# Altium integrated library YenDoo.IntLib: 60 symbols
Pins are listed as number, name and electrical type; pins without a type are passive.

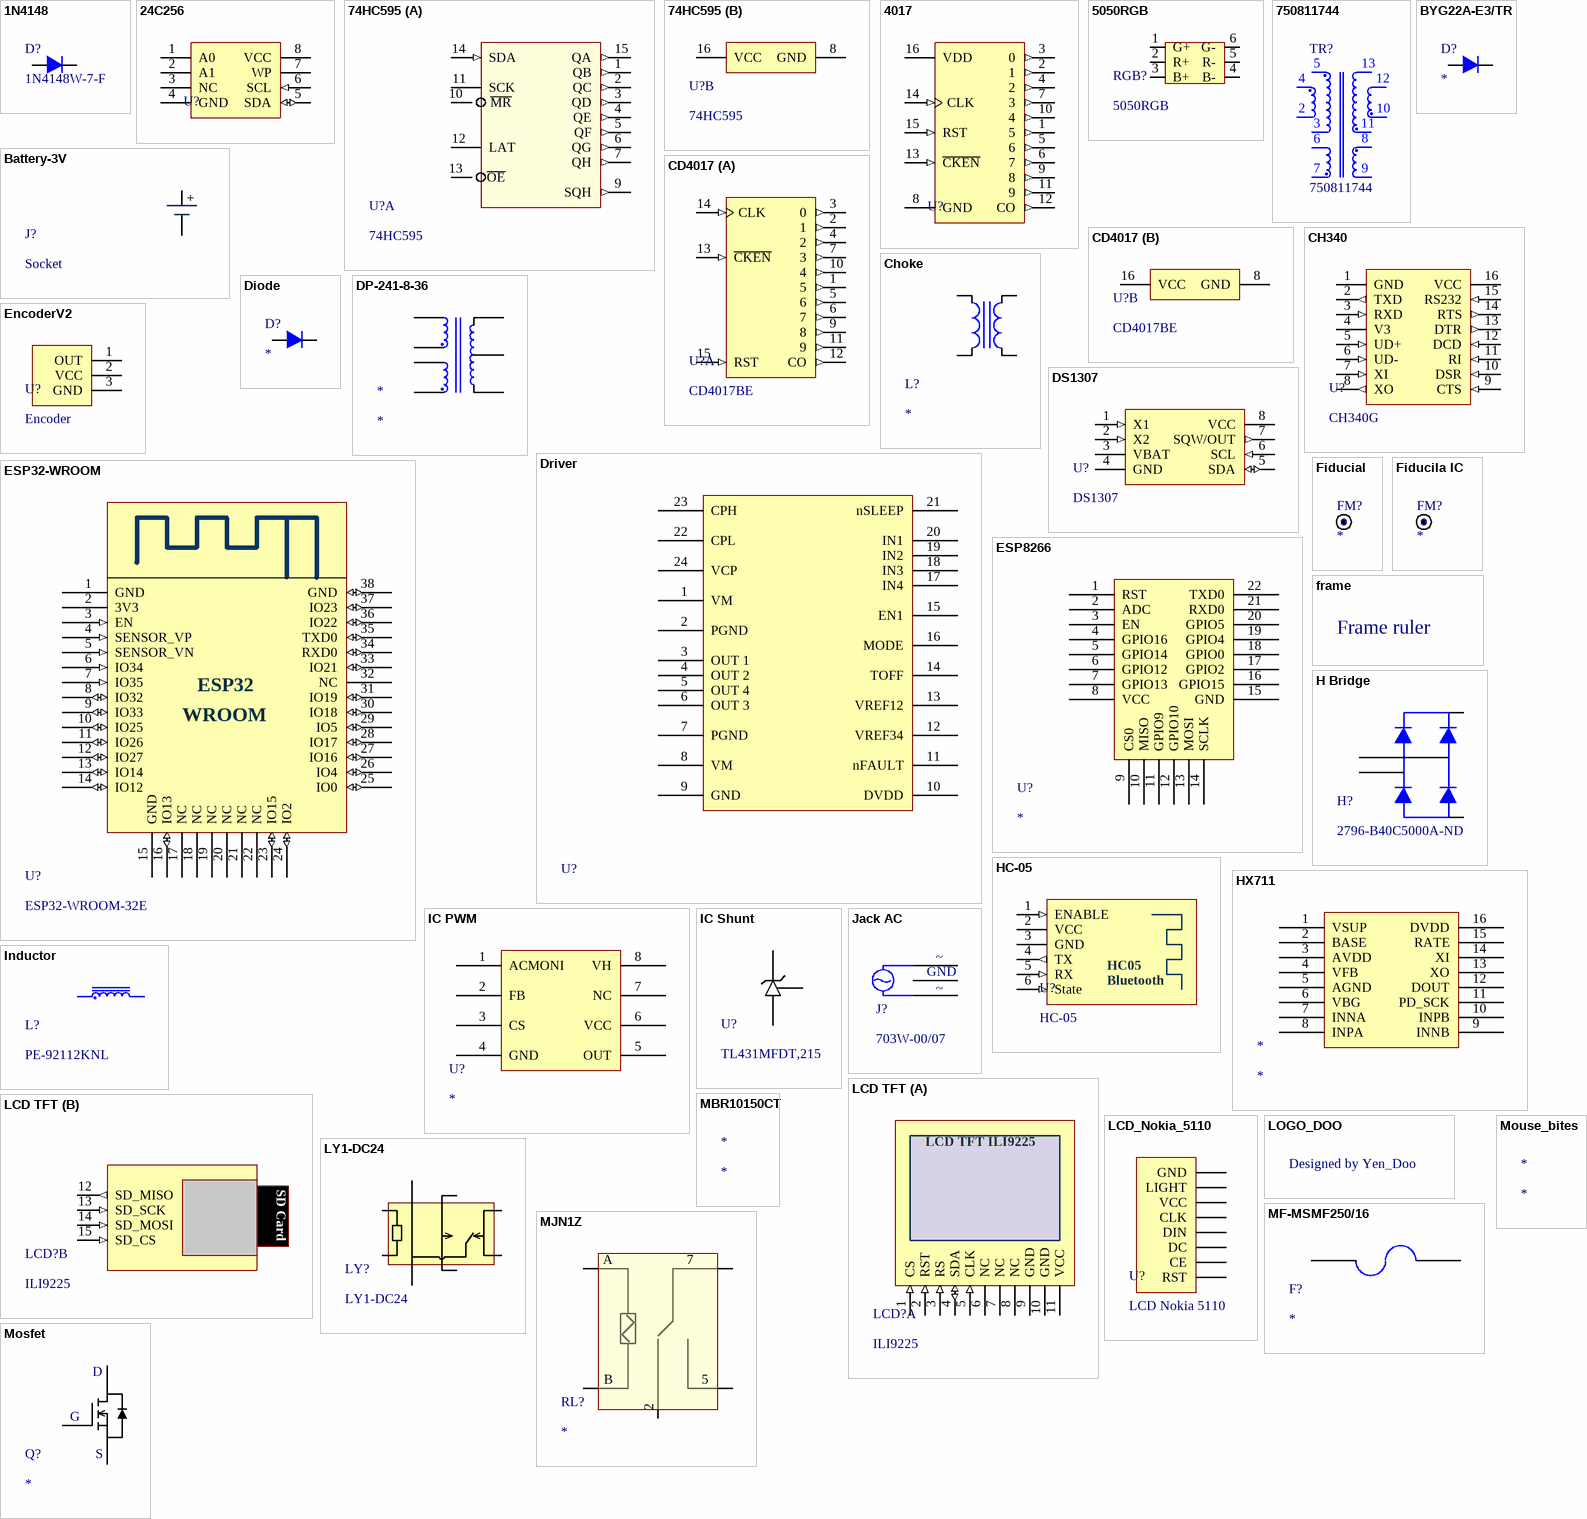
[diagram p0: symbols 1N4148 to Mouse_bites]

## 1N4148
designator D?, comment 1N4148W-7-F
Diode Standard 100 V 300mA (DC) Surface Mount SOD-123; Mfr: Diodes Incorporated; Voltage - DC Reverse (Vr) (Max): 100 V; Voltage - Forward (Vf) (Max) @ If: 1.25 V @ 150 mA; Speed: Small Signal =< 200mA (Io), Any Speed; Reverse Recovery Time (trr): 4 ns; Current - Reverse Leakage @ Vr: 1 µA @ 100 V; Capacitance @ Vr, F: 2pF @ 0V, 1MHz; ComponentLink1Description: New link; ComponentLink1URL: https://www.digikey.com/en/products/detail/diodes-incorporated/1N4148W-7-F/814371; Diode Type: Standard; Current - Average Rectified (Io): 300mA (DC); Mounting Type: Surface Mount
footprint 1N4148 (SODFL, 2-Leads, Body 1.55x4.05mm, IPC Medium Density)
pins: 1 A, 2 K

## 24C256
designator U?  (value not drawn)
EEPROM Memory IC 256Kb (32K x 8) I²C 1 MHz 550 ns 8-SOIC; Mfr: Microchip Technology; Memory Type: Non-Volatile; Clock Frequency: 1 MHz; Write Cycle Time - Word, Page: 5ms; Access Time: 550 ns; Voltage - Supply: 1.7V ~ 5.5V; Base Product Number: AT24C256C; Category: Integrated Circuits (ICs); Memory Format: EEPROM; Technology: EEPROM; Memory Size: 256Kb (32K x 8); Memory Interface: I²C; Operating Temperature: -40°C ~ 85°C (TA); Mounting Type: Surface Mount; Package / Case: 8-SOIC (0.154", 3.90mm Width); Supplier Device Package: 8-SOIC; ComponentLink1Description: Digikey; ComponentLink1URL: https://www.digikey.com/en/products/detail/microchip-technology/AT24C256C-SSHL-T/2271166
footprint SOIC-8 (SOIC, 8-Leads, Body 5.00x4.00mm, Pitch 1.27mm, IPC Medium Density)
pins: 1 A0, 2 A1, 3 NC, 4 GND (power), 5 SDA (io), 6 SCL (in), 7 WP, 8 VCC (power)

## 74HC595
designator U?
8-Bit Shift Registers With 3-State Output Registers; Mfr: Texas Instruments; Output Type: Tri-State; Number of Elements: 1; Number of Bits per Element: 8; Function: Serial to Parallel, Serial; Voltage - Supply: 2V ~ 6V; Logic Type: Shift Register; ComponentLink1Description: datasheet; ComponentLink1URL: https://www.ti.com/lit/ds/scls041j/scls041j.pdf?ts=1672570074626&ref_url=https%253A%252F%252Fwww.google.com%252F; Operating Temperature: -40°C ~ 85°C; Mounting Type: Surface Mount; Package / Case: 16-SOIC (0.154", 3.90mm Width)
footprint SOT16 (SOIC, 16-Leads, Body 10.20x5.30mm, Pitch 1.27mm, IPC Medium Density)
part A pins: 1 QB (out), 2 QC (out), 3 QD (out), 4 QE (out), 5 QF (out), 6 QG (out), 7 QH (out), 9 SQH (out) "OUTPUT", 10    ~{MR} "OUTPUT", 11 SCK "OUTPUT", 12 LAT "OUTPUT", 13   ~{OE} "OUTPUT", 14 SDA (in) "OUTPUT", 15 QA (out)
part B pins: 8 GND, 16 VCC

## 4017
designator U?, comment CD4017BM  (value not drawn)
Counter ICs CMOS Decade Counter; Manufacturer: Texas Instruments; Logic Family: CD4000; Number of Bits: 10 bit; Counting Method: Synchronous; Counting Sequence: Up; Operating Supply Voltage: 3 V to 18 V; Output Current: 1.5 mA; Product Category: Counter ICs; Counter Type: Decade; Minimum Operating Temperature: - 55 C; Maximum Operating Temperature: + 125 C
footprint SOP16 (SOP, 16-Leads, Body 10.20x5.30mm, Pitch 1.27mm, IPC Medium Density)
footprint SO16 (SOIC, 16-Leads, Body 9.90x3.90mm, Pitch 1.27mm, IPC Medium Density)
pins: 1 5 (out), 2 1 (out), 3 0 (out), 4 2 (out), 5 6 (out), 6 7 (out), 7 3 (out), 8 GND (power), 9 8 (out), 10 4 (out), 11 9 (out), 12 CO (out), 13 ~{CKEN} (in), 14 CLK (in), 15 RST (in), 16 VDD (power)

## 5050RGB
designator RGB?
Led rgb 5050
footprint 5050RGB
pins: 1 G+, 2 R+, 3 B+, 4 B-, 5 R-, 6 G-

## 750811744
designator TR?
Flyback Converters For For DC/DC Converters SMPS Transformer 4000Vrms Isolation 80kHz Through Hole; Mfr: Würth Elektronik; Inductance @ Frequency: 450µH @ 10kHz; Voltage - Auxiliary: 14V @ 50mA; Voltage - Primary: 90 ~ 375V; Height - Seated (Max): 1.200" (30.48mm); Size / Dimension: 1.559" L x 1.700" W (39.60mm x 43.18mm); Mounting Type: Through Hole; Frequency: 80kHz; Operating Temperature: -40°C ~ 125°C; Voltage - Isolation: 4000Vrms; Applications: Flyback Converters; Type: For DC/DC Converters; Package: Tray; Series: MID-OLON; Category: Transformers
footprint 750811744
pins: 2, 3, 4, 5, 6, 7, 8, 9, 10, 11, 12, 13

## Battery-3V
designator J?, comment Socket
Socket CR1220 SMD
footprint SocketPin3V
pins: 1 Vcc, 2 GND
text: +

## BYG22A-E3/TR
designator D?
footprint BYG22A-E3/TR (Molded Diode, 2-Leads, Body 5.28x2.67mm, IPC Medium Density)
pins: 1 A, 2 K

## CD4017
designator U?, comment CD4017BE
IC 10-OUT DECADE COUNTER 16-DIP; Mfr: Texas Instruments; Logic Type: Counter, Decade; Direction: Up; Number of Elements: 1; Number of Bits per Element: 10; Reset: Asynchronous; Timing: Synchronous; Count Rate: 5.5 MHz; Trigger Type: Positive Edge; Voltage - Supply: 3 V ~ 18 V; Category: Integrated Circuits (ICs); ComponentLink1Description: thegioiic; ComponentLink1URL: https://www.thegioiic.com/cd40174be-ic-flip-flop-d-type-positive-edge-16mhz-16-dip; Operating Temperature: -55°C ~ 125°C; Mounting Type: Through Hole; Package / Case: 16-DIP (0.300", 7.62mm)
part A pins: 1 5 (out), 2 1 (out), 3 0 (out), 4 2 (out), 5 6 (out), 6 7 (out), 7 3 (out), 9 8 (out), 10 4 (out), 11 9 (out), 12 CO (out), 13 ~{CKEN} (in), 14 CLK (in), 15 RST (in)
part B pins: 8 GND, 16 VCC

## CH340
designator U?, comment CH340G
USB Bridge, USB to UART USB 2.0 UART Interface; Mfr: SparkFun Electronics; Standards: USB 2.0; Voltage - Supply: 3V ~ 3.6V; Current - Supply: 20mA; Protocol: USB; Function: Bridge, USB to UART; Interface: UART; Operating Temperature: -20°C ~ 70°C (TA); ComponentLink1Description: Thegioiic; ComponentLink1URL: https://www.thegioiic.com/ch340g; ComponentLink2Description: Datasheet; ComponentLink2URL: https://www.thegioiic.com/upload/documents/5d39d5f0043101a4c964078db79fe1bd.PDF
footprint DSIP-16 (SOIC, 16-Leads, Body 10.40x5.30mm, Pitch 1.27mm, Thermal Pad 0.00x0.00mm, IPC Medium Density)
pins: 1 GND (power), 2 TXD (out), 3 RXD (in), 4 V3 (power), 5 UD+ (in), 6 UD- (in), 7 XI (in), 8 XO (out), 9 CTS (in), 10 DSR (in), 11 RI (in), 12 DCD (in), 13 DTR (out), 14 RTS (out), 15 RS232 (in), 16 VCC (power)

## Choke
designator L?
Common Mode Chokes / Filters 1amp 20uH; Manufacturer: KEMET; Number of Channels: 1 Channel; Maximum DC Current: 1 A; Test Frequency: 1 kHz; Product Category: Common Mode Chokes / Filters; Mounting Style: Vertical Mount; Series: SU-9VD; Termination Style: Through Hole; Inductance: 20 uH; Minimum Operating Temperature: - 25 C; Maximum Operating Temperature: + 120 C; Length: 17 mm; Width: 11 mm; Height: 17 mm; Product: Common Mode Chokes
pins: 1, 2, 3, 4

## Diode
designator D?
footprint SMA (Molded Diode, 2-Leads, Body 4.38x2.50mm, IPC Medium Density)
footprint MBR10150CT (TO-220F-3)
footprint Flat Lead (SODFL, 2-Leads, Body 1.45x2.60mm, IPC Medium Density)
pins: 1 A, 2 K

## DP-241-8-36
designator *
pins: 1 F2, 2 S2, 3 F1, 4 S1, 5 S, CT 6, F 7

## Driver
designator U?, comment DRV8955PRGER  (value not drawn)
Half Bridge (4) Driver DC Motors, Solenoids Power MOSFET 24-VQFN (4x4); Mfr: Texas Instruments; Interface: Logic, PWM; Load Type: Inductive, Resistive; Rds On (Typ): 165mOhm; Current - Output / Channel: 10A; Voltage - Supply: 4.5V ~ 48V; Fault Protection: Over Current, Over Voltage, UVLO; Output Configuration: Half Bridge (4); Applications: DC Motors, Solenoids; Technology: Power MOSFET; Current - Peak Output: 10A; Voltage - Load: 4.5V ~ 48V; Operating Temperature: -40°C ~ 125°C; Features: Charge Pump; Supplier Device Package: 24-VQFN (4x4); ComponentLink1Description: Digikey; ComponentLink1URL: https://www.digikey.com/en/products/detail/texas-instruments/DRV8955PRGER/13627200
footprint DRV8955
pins: 1 VM, 2 PGND, 3 OUT 1, 4 OUT 2, 5 OUT 4, 6 OUT 3, 7 PGND, 8 VM, 9 GND, 10 DVDD, 11 nFAULT, 12 VREF34, 13 VREF12, 14 TOFF, 15 EN1, 16 MODE, 17 IN4, 18 IN3, 19 IN2, 20 IN1, 21 nSLEEP, 22 CPL, 23 CPH "Charge pump switching node. Connect a X7R, 0.022-μF, VM-rated ceramic capacitor from CPH to CPL.", 24 VCP

## DS1307
designator U?
Real Time Clock (RTC) IC Clock/Calendar 56B I²C, 2-Wire Serial 8-SDIP (0.300", 7.62mm); Mfr: Analog Devices Inc./Maxim Integrated; Time Format: HH:MM:SS (12/24 hr); Date Format: YY-MM-DD-dd; Voltage - Supply: 4.5V ~ 5.5V; Voltage - Supply, Battery: 2V ~ 3.5V; Current - Timekeeping (Max): 200µA @ 5V; Category: Integrated Circuits (ICs); Type: Clock/Calendar; Features: Leap Year, NVSRAM, Square Wave Output; Memory Size: 56B; Interface: I²C, 2-Wire Serial; Operating Temperature: 0°C ~ 70°C; Base Product Number: DS1307; ComponentLink1Description: Datasheet; ComponentLink1URL: https://www.analog.com/media/en/technical-documentation/data-sheets/ds1307.pdf; ComponentLink2Description: Thegioiic; ComponentLink2URL: https://www.thegioiic.com/ds1307z-ic-rtc-clock-calendar-56b-8-soic
footprint SOIC-4 (SOIC, 8-Leads, Body 4.88x3.91mm, Pitch 1.27mm, Thermal Pad 0.00x0.00mm, IPC Medium Density)
pins: 1 X1 (in), 2 X2 (in), 3 VBAT (power), 4 GND (power), 5 SDA (io), 6 SCL (in), 7 SQW/OUT (out), 8 VCC (power)

## EncoderV2
designator U?, comment Encoder
Mạch Cảm Biến Tốc Độ Encoder V2; Supply voltage: 3.3-5V; Supply current: 15mA; Output signal level: Digital TTL; Distance tranceiver: 5mm
footprint EncoderV2
pins: 1 OUT, 2 VCC, 3 GND

## ESP32-WROOM
designator U?, comment ESP32-WROOM-32E
Bluetooth, WiFi 802.11b/g/n, Bluetooth v4.2 +EDR, Class 1, 2 and 3 Transceiver Module 2.4GHz ~ 2.5GHz Integrated, Trace Surface Mount; Mfr: Espressif Systems; Utilized IC / Part: ESP32-D0WD-V3; Modulation: CCK, DSSS, OFDM; Data Rate: 150Mbps; Power - Output: 20dBm; Sensitivity: -98dBm; Serial Interfaces: ADC, GPIO, I²C, I²S, PWM, SDIO, SPI, UART; Memory Size: 4MB Flash, 448kB ROM, 536kB SRAM; Voltage - Supply: 3V ~ 3.6V; Category: RF and Wireless; Series: ESP32; RF Family/Standard: Bluetooth, WiFi; Protocol: 802.11b/g/n, Bluetooth v4.2 +EDR, Class 1, 2 and 3; Frequency: 2.4GHz ~ 2.5GHz; Antenna Type: Integrated, Trace; Mounting Type: Surface Mount; ComponentLink1Description: Hshop; ComponentLink1URL: https://hshop.vn/products/mach-thu-phat-wifi-ble-soc-esp32-v1; Operating Temperature: -40°C ~ 85°C; ComponentLink2Description: Datasheet; ComponentLink2URL: https://www.espressif.com/sites/default/files/russianDocumentation/esp32-wroom-32e_esp32-wroom-32ue_datasheet_en.pdf
footprint ESP32-WROOM
pins: 1 GND (power), 2 3V3 (power), 3 EN (in), 4 SENSOR_VP (in), 5 SENSOR_VN (in), 6 IO34 (in), 7 IO35 (in), 8 IO32 (io), 9 IO33 (io), 10 IO25 (io), 11 IO26 (io), 12 IO27 (io), 13 IO14 (io), 14 IO12 (io), 15 GND (power), 16 IO13 (io), 17 NC (hiz), 18 NC (hiz), 19 NC (hiz), 20 NC (hiz), 21 NC (hiz), 22 NC (hiz), 23 IO15 (io), 24 IO2 (io), 25 IO0 (io), 26 IO4 (io), 27 IO16 (io), 28 IO17 (io), 29 IO5 (io), 30 IO18 (io), 31 IO19 (io), 32 NC (hiz), 33 IO21 (io), 34 RXD0 (io), 35 TXD0 (io), 36 IO22 (io), 37 IO23 (io), 38 GND (io)
text: WROOM

## ESP8266
designator U?
footprint ESP8266
pins: 1 RST, 2 ADC, 3 EN, 4 GPIO16, 5 GPIO14, 6 GPIO12, 7 GPIO13, 8 VCC, 9 CS0, 10 MISO, 11 GPIO9, 12 GPIO10, 13 MOSI, 14 SCLK, 15 GND, 16 GPIO15, 17 GPIO2, 18 GPIO0, 19 GPIO4, 20 GPIO5, 21 RXD0, 22 TXD0

## Fiducial
designator FM?
footprint FUDICIAL_MARKER

## Fiducila IC
designator FM?
footprint Fiducial Mark IC

## frame
designator FR?, comment Frame  (value not drawn)
Frame in ruler
footprint Frame_Rec in TopOverlay
text: Frame ruler

## H Bridge
designator H?, comment 2796-B40C5000A-ND
Bridge Rectifier Single Phase Standard 80 V Through Hole 4-SIP; Voltage - Peak Reverse (Max): 80 V; Current - Average Rectified (Io): 4 A; Voltage - Forward (Vf) (Max) @ If: 1 V @ 5 A; Current - Reverse Leakage @ Vr: 5 µA @ 80 V; Diode Type: Single Phase; Technology: Standard; Operating Temperature: -50°C ~ 150°C (TJ); Mounting Type: Through Hole; Package / Case: 4-SIP; Supplier Device Package: 4-SIP; ComponentLink1Description: Digikey; ComponentLink1URL: https://www.digikey.com/en/products/detail/diotec-semiconductor/B40C5000A/13155422
footprint b40c500033
footprint GBJ-4
pins: 1 +, 2 ~, 3 ~, 4 -

## HC-05
designator U?
HC-05 Bluetooth module follows the IEEE 802.15.1 standardized protocol, through which one can build a wireless Personal Area Network (PAN). It uses frequency-hopping spread spectrum (FHSS) radio technology to send data over the air.; Bluetooth protocol: Bluetooth Specification v2.0+EDR; Frequency: 2.4GHz ISM band; Modulation: GFSK (Gaussian Frequency Shift Keying); Emission power: ≤4dBm, Class 2; Sensitivity: ≤-84dBm at 0.1% BER; Speed: Asynchronous communication: 2.1Mbps (Max) / 160 kbps, Synchronous communication: 1Mbps/1Mbps; Security: Authentication and encryption; Supply Voltage: +3.3V to 6.0 V; Supply Current: 30mA; Working temperature: -20 ~ +75Centigrade; Dimension: 26.9mm x 13mm x 2.2 mm; ComponentLink1Description: Hshop; ComponentLink1URL: https://hshop.vn/products/mach-thu-phat-bluetooth-hc-05-do-ra-chon-master
footprint HC-05
pins: 1 ENABLE (in), 2 VCC (power), 3 GND (power), 4 TX (out), 5 RX (in), 6 State (in)
text: HC05; Bluetooth

## HX711
designator *
footprint HX711 (TSOP, 16-Leads, Body 9.90x3.90mm, Pitch 1.27mm, IPC Medium Density)
pins: 1 VSUP, 2 BASE, 3 AVDD, 4 VFB, 5 AGND, 6 VBG, 7 INNA, 8 INPA, 9 INNB, 10 INPB, 11 PD_SCK, 12 DOUT, 13 XO, 14 XI, 15 RATE, 16 DVDD

## IC PWM
designator U?
footprint SOP-J8 (SOIC, 8-Leads, Body 5.00x4.00mm, Pitch 1.27mm, IPC Medium Density)
pins: 1 ACMONI, 2 FB, 3 CS, 4 GND, 5 OUT, 6 VCC, 7 NC, 8 VH

## IC Shunt
designator U?, comment TL431MFDT,215
IC VREF SHUNT ADJ 2% TO236AB; Mfr: Nexperia USA Inc.; Output Type: Adjustable; Voltage - Output (Min/Fixed): 2.495V; Voltage - Output (Max): 36 V; Current - Output: 100 mA; Current - Cathode: 1 mA; Base Product Number: TL431; Category: Integrated Circuits (ICs); Reference Type: Shunt; Tolerance: ±2%; Operating Temperature: -40°C ~ 125°C (TA); Mounting Type: Surface Mount; Package / Case: TO-236-3, SC-59, SOT-23-3; Parameter 14: *; ComponentLink1Description: Digikey; ComponentLink1URL: https://www.digikey.com/en/products/detail/nexperia-usa-inc/TL431MFDT-215/2780405
footprint TO-236AB (SOT223, 3-Leads, Body 2.90x2.30mm (avg), Pitch 1.90mm, IPC Medium Density)
pins: 1, 2, 3

## Inductor
designator L?, comment PE-92112KNL
100 µH Unshielded Toroidal Inductor 5 A 34mOhm Max Radial, Vertical (Open); Mfr: Pulse Electronics Power; Inductance: 100 µH; Tolerance: ±20%; Current Rating (Amps): 5 A; Inductance Frequency - Test: 20 kHz; Type: Toroidal; DC Resistance (DCR): 34mOhm Max; Operating Temperature: -40°C ~ 130°C; Mounting Type: Through Hole; Size / Dimension: 1.300" L x 0.700" W (33.02mm x 17.78mm); Height - Seated (Max): 1.400" (35.56mm); ComponentLink1Description: Digikey; ComponentLink1URL: https://www.digikey.com/en/products/detail/pulse-electronics-power/PE-92112KNL/2265966?s=N4IgTCBcDaIAoFEC0BOMBGdYDSA5AMiALoC%2BQA
footprint PE-92112KNL
pins: 1, 2

## Jack AC
designator J?, comment 703W-00/07
Power Entry Connector Receptacle, Male Blades IEC 320-C14 Panel Mount, Flange; Mfr: Qualtek; Current - IEC: 10A; Voltage - IEC: 250VAC; Number of Positions: 3; Panel Thickness: 0.118" (3.00mm); Connector Style: IEC 320-C14; Mounting Type: Panel Mount, Flange; Through Hole, Right Angle; Panel Cutout Dimensions: Rectangular - 31.10mm x 23.30mm; ComponentLink1Description: Digikey; ComponentLink1URL: https://www.digikey.com/en/products/detail/qualtek/703W-00-54/245561
footprint 703w0007
footprint 703w0053
pins: 1 VAC, 2 GND, 3 VAC
text: ~

## LCD TFT
designator LCD?, comment ILI9225
The ILI9225 is a 262,144-color one-chip SoC driver for a-TFT liquid crystal display with resolution of 176RGBx220 dots, comprising a 528-channel source driver, a 220-channel gate driver, 87120 bytes RAM for graphic data of 176RGBx220 dots, and power supply circuit.; Display Color: 16BIT RGB 65K color; Screen Size: 2.2(inch); Resolution: 176*220 (Pixel); Module Interface: 4-wire SPI interface; Backlight: 3 White Led; Active Area: 34.85x43.56 (mm); Module PCB Size: 42.46x67.20 (mm); Operating Voltage: 5V/3.3V; Power Consumption: TBD; Rough Weight(Package containing): 23 (g); SKU: MAR2201; Type: TFT; Driver IC: ILI9225; Operating Temperature: -20℃~60℃; Storage Temperature: -30℃~70℃; ComponentLink1Description: Hshop; ComponentLink1URL: https://hshop.vn/products/man-hinh-lcd-tft-2-inch-ili9225-giao-tiep-spi; ComponentLink2Description: Thegioiic; ComponentLink2URL: https://www.thegioiic.com/lcd-2inch-176x220-tft-ili9225-giao-tiep-spi
footprint LCD TFT ILI9225
part A pins: 1 CS (in), 2 RST (in), 3 RS (in), 4 SDA (io), 5 CLK (in), 6 NC, 7 NC, 8 NC, 9 GND (power), 10 GND (power), 11 VCC (power)
part B pins: 12 SD_MISO (out), 13 SD_SCK (in), 14 SD_MOSI (in), 15 SD_CS (in)
part A text: LCD TFT ILI9225
part B text: SD Card

## LCD_Nokia_5110
designator U?, comment LCD Nokia 5110
footprint LCD5110
pins: 1 RST, 2 CE, 3 DC, 4 DIN, 5 CLK, 6 VCC, 7 LIGHT, 8 GND

## LOGO_DOO
designator *  (value not drawn)
footprint Logo_Top_Layer
footprint Logo_Top_Overlay
footprint LogoPIFWeb
text: Designed by Yen_Doo

## LY1-DC24
designator LY?
General Purpose Relay SPDT (1 Form C) 24VDC Coil Socketable; Mfr: Omron Automation and Safety; Contact Rating (Current): 15 A; Switching Voltage: 250VAC, 125VDC - Max; Coil Current: 36.9 mA; Coil Type: Non Latching; Must Operate Voltage: 19.2 VDC; Must Release Voltage: 2.4 VDC; Operate Time: 25 ms; Coil Resistance: 650 Ohms; ComponentLink1Description: New link; ComponentLink1URL: https://www.digikey.com/en/products/detail/omron-automation-and-safety/LY1-DC24/126843?s=N4IgTCBcDaIDIE0CMBaAIgYTAFhAXQF8g; Mounting Type: Socketable; Coil Voltage: 24VDC; Contact Form: SPDT (1 Form C); Termination Style: Plug In; Release Time: 25 ms; Operating Temperature: -25°C ~ 55°C
footprint LY1-DC24
pins: 1, 2, 3, 4, 5, 6, 7, 8

## MBR10150CT
designator *

## MF-MSMF250/16
designator F?
footprint MF-MSMF250/16
pins: 1, 2

## MJN1Z
designator RL?
footprint MJN1Z
pins: 2 NC, 5 NO, 7 COM, A, B

## Mosfet
designator Q?
footprint FQPF8N90C (TO-220F-3)
pins: 1 G, 2 D, 3 S

## Mouse_bites
designator *
footprint Mouse_bites

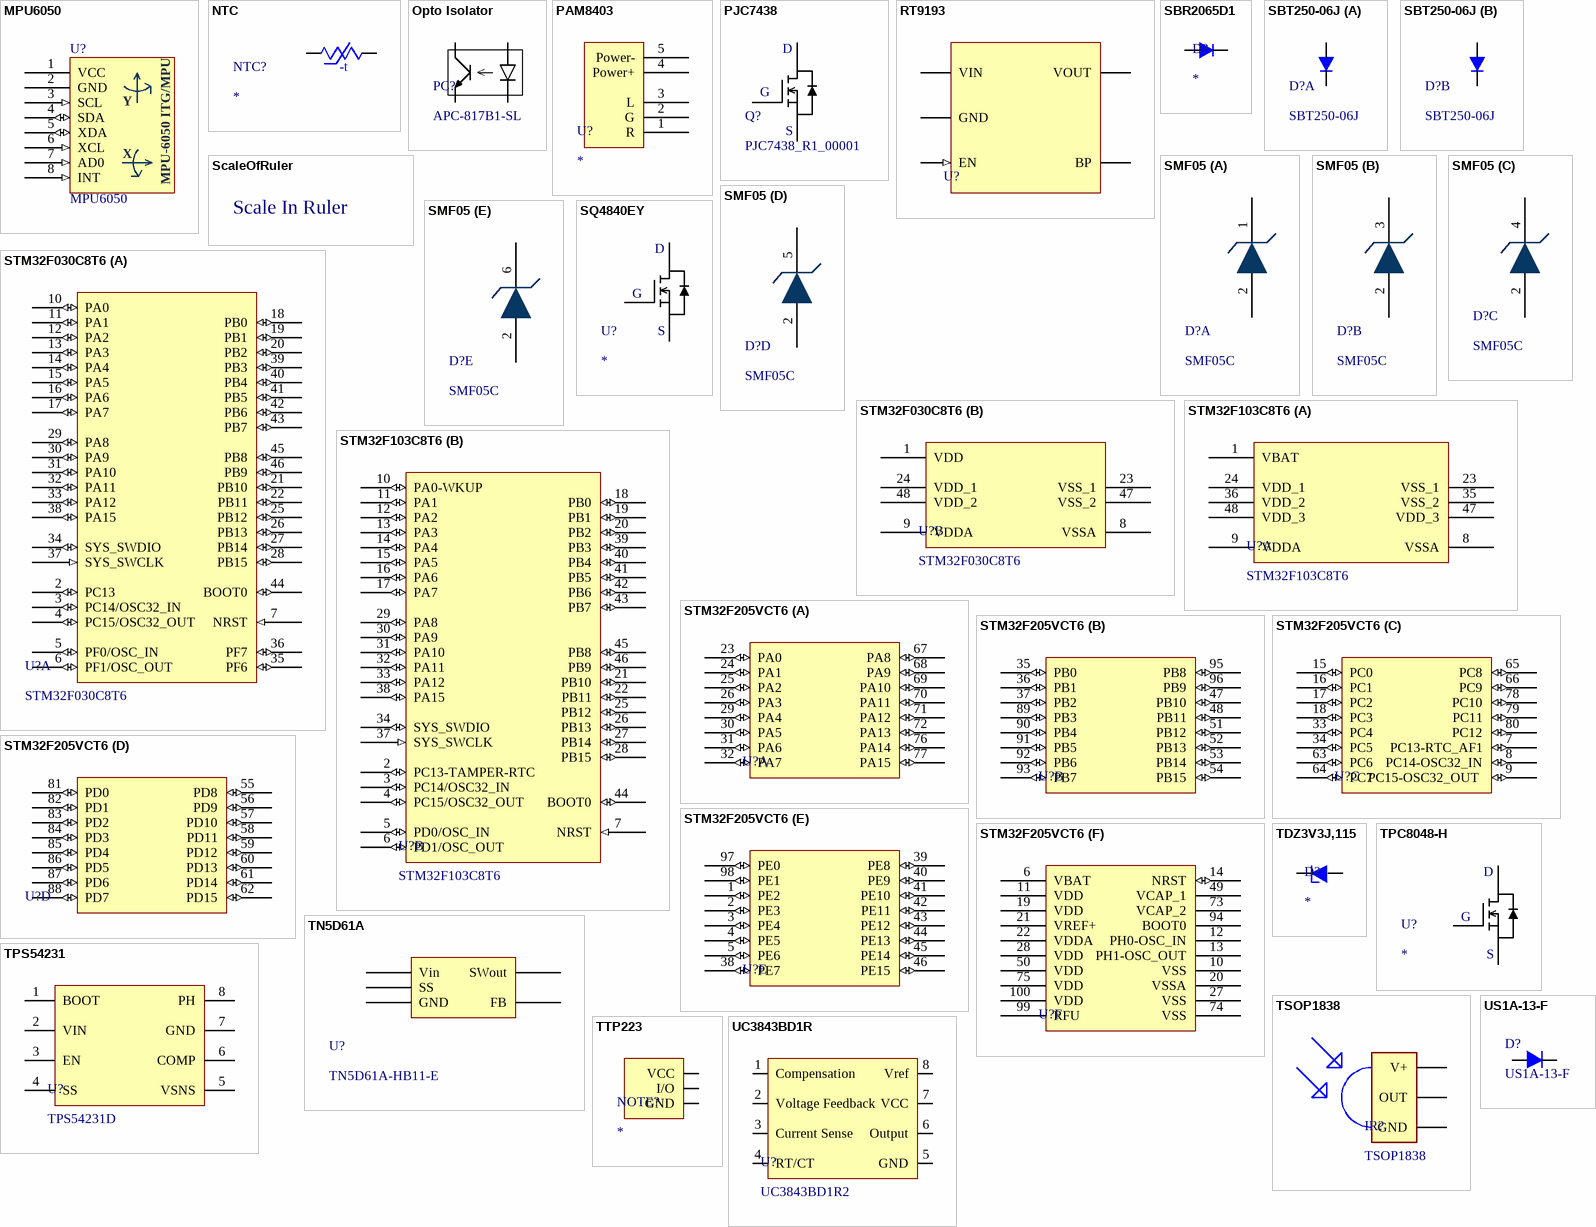
[diagram p1: symbols MPU6050 to US1A-13-F]

## MPU6050
designator U?
The MPU-6050™ parts are the world’s first MotionTracking devices designed for the low power, low cost, and high-performance requirements of smartphones, tablets and wearable sensors.; Mfr: DFRobot; Sensing Range: ±2g, 4g, 8g, 16g, ±250°/sec, ±500°/sec, ±1000°/sec, ±2000°/sec; Sensor Type: Accelerometer, Gyroscope, 3 Axis; Interface: I2C; Voltage - Supply: 3V ~ 5V; Category: Development Boards, Kits, Programmers; Utilized IC / Part: MPU-6050; ComponentLink1Description: Hshop; ComponentLink1URL: https://hshop.vn/products/cam-bien-6-dof-bac-tu-do-gy-521-mpu6050
footprint MPU-6050
pins: 1 VCC (power), 2 GND (power), 3 SCL (in), 4 SDA (io), 5 XDA (io), 6 XCL (in), 7 AD0 (in), 8 INT (in)
text: Y; X; MPU-6050 ITG/MPU

## NTC
designator NTC?
THERMISTOR NTC 15OHM 3000K; Mfr: EPCOS - TDK Electronics; Product Status: Active; R @ 25°C: 15 Ohms; Tolerance: ±20%; Current - Steady State Max: 4 A; Approval Agency: UL; Category: Circuit Protection; Series: S234; Package: Bulk; Diameter: 0.591" (15.00mm); Lead Spacing: 0.295" (7.50mm)
footprint NTC
pins: 1, 2
text: -t

## Opto Isolator
designator PC?, comment APC-817B1-SL
DIP4, DC INPUT, PHOTO TRANSISTOR; Mfr: American Bright Optoelectronics Corporation; Number of Channels: 1; Voltage - Isolation: 5000Vrms; Current Transfer Ratio (Min): 130% @ 5mA; Current Transfer Ratio (Max): 260% @ 5mA; Rise / Fall Time (Typ): 3µs, 4µs; Voltage - Output (Max): 35V; Current - Output / Channel: 50mA; Voltage - Forward (Vf) (Typ): 1.24V; Current - DC Forward (If) (Max): 60 mA; Vce Saturation (Max): 200mV; Category: Isolators; Series: APC-817; Input Type: DC; Output Type: Transistor; Operating Temperature: -55°C ~ 110°C; Package / Case: 4-SMD, Gull Wing; Base Product Number: APC-817; ComponentLink1Description: Digikey; ComponentLink1URL: https://www.digikey.com/en/products/detail/american-bright-optoelectronics-corporation/APC-817B1-SL/16273138?s=N4IgTCBcDaIIIAUDCAOAjAdgLQCE1YGUAZEAXQF8g
footprint APC-817B1-SL (SOP, 4-Leads, Body 4.68x6.60mm, Pitch 2.54mm, IPC Medium Density)
pins: 1, 2, 3, 4

## PAM8403
designator U?
footprint PAM8403
pins: 1 R, 2 G, 3 L, 4 Power+, 5 Power-

## PJC7438
designator Q?, comment PJC7438_R1_00001
N-Channel 50 V 400mA (Ta) 350mW (Ta) Surface Mount SOT-323; Mfr: Panjit International Inc.; Drain to Source Voltage (Vdss): 50 V; Drive Voltage (Max Rds On, Min Rds On): 1.8V, 10V; Rds On (Max) @ Id, Vgs: 1.45Ohm @ 500mA, 10V; Vgs(th) (Max) @ Id: 1V @ 250µA; Gate Charge (Qg) (Max) @ Vgs: 0.95 nC @ 4.5 V; Vgs (Max): ±20V; Input Capacitance (Ciss) (Max) @ Vds: 36 pF @ 25 V; ComponentLink1Description: New link; ComponentLink1URL: https://www.panjit.com.tw/upload/datasheet/PJC7438.pdf; FET Type: N-Channel; Technology: MOSFET (Metal Oxide); Current - Continuous Drain (Id) @ 25°C: 400mA (Ta); Power Dissipation (Max): 350mW (Ta); Operating Temperature: -55°C ~ 150°C (TJ); Mounting Type: Surface Mount; Package / Case: SC-70, SOT-323
footprint PJC7438 (SOT223, 3-Leads, Body 2.00x2.10mm (avg), Pitch 1.40mm, IPC Medium Density)
pins: 1 G, 2 S, 3 D

## RT9193
designator U?, comment RT9193-33GB  (value not drawn)
IC REG LINEAR 3.3V 300MA SOT23-5; Mfr: Richtek USA Inc.; Output Type: Fixed; Number of Regulators: 1; Voltage - Input (Max): 5.5V; Voltage Dropout (Max): 0.3V @ 300mA; Current - Quiescent (Iq): 130 µA; PSRR: 70dB ~ 50dB (100Hz ~ 10kHz); Control Features: Enable; Protection Features: Over Current, Over Temperature; Category: Integrated Circuits (ICs); Voltage - Output (Min/Fixed): 3.3V; ComponentLink1Description: Digikey; ComponentLink1URL: https://www.digikey.com/en/products/detail/richtek-usa-inc/RT9193-33GB/2470048; Current - Output: 300mA; Operating Temperature: -40°C ~ 125°C; Mounting Type: Surface Mount; Package / Case: SC-74A, SOT-753; Supplier Device Package: SOT-23-5; ComponentLink2Description: Thegioiic; ComponentLink2URL: https://www.thegioiic.com/products?search=RT9193; ComponentLink3Description: Datasheet; ComponentLink3URL: https://www.richtek.com/assets/product_file/RT9193/DS9193-18.pdf
footprint SOT-23-5 (SOT23, 5-Leads, Body 2.90x2.79mm, Pitch 1.00mm, IPC Medium Density)
pins: 1 VIN (power), 2 GND (power), 3 EN (in), 4 BP, 5 VOUT (power)

## SBR2065D1
designator D?
ComponentLink1Description: New link; ComponentLink1URL: https://www.diodes.com/assets/Datasheets/SBR2065D1.pdf
footprint SBR2065D1 (D-PAK, 3-Pads, Body 6.20x6.71mm (max), IPC Medium Density)
pins: 1 A, 3 A, 4 K

## SBT250-06J
designator D?
Diode Array 1 Pair Common Cathode Schottky 60 V 25A Through Hole TO-220-3 Full Pack; Mfr: onsemi; Voltage - DC Reverse (Vr) (Max): 60 V; Voltage - Forward (Vf) (Max) @ If: 600 mV @ 10 A; Speed: Fast Recovery =< 500ns, > 200mA (Io); Current - Reverse Leakage @ Vr: 300 µA @ 30 V; Diode Configuration: 1 Pair Common Cathode; Diode Type: Schottky; Current - Average Rectified (Io) (per Diode): 25A; Operating Temperature - Junction: -55°C ~ 150°C; Mounting Type: Through Hole; ComponentLink1Description: Digikey; ComponentLink1URL: https://www.digikey.com/en/products/detail/onsemi/SBT250-06J/2165220
footprint SBT250-06J
part A pins: 1 A, 2 K
part B pins: 1 A, 2 K, 3 A

## ScaleOfRuler
designator SC?, comment Scale in ruler  (value not drawn)
Scale in ruler PCB by PIF
footprint TopLayer_Ruler_10cm_UnitCm
footprint TopLayer_Ruler_10cm_UnitInch
footprint TopOverlay_Ruler_10cm_UnitCm
footprint TopOverlay_Ruler_10cm_UnitInch
text: Scale In Ruler

## SMF05
designator D?, comment SMF05C
12.5V Clamp 8A (8/20µs) Ipp Tvs Diode Surface Mount SC-70-6; Mfr: Semtech Corporation; Type: Zener; Unidirectional Channels: 5; Voltage - Reverse Standoff (Typ): 5V (Max); Voltage - Breakdown (Min): 6V; Power - Peak Pulse: 100W; Capacitance @ Frequency: 130pF @ 1MHz; Category: Circuit Protection; Voltage - Clamping (Max) @ Ipp: 12.5V; Current - Peak Pulse (10/1000µs): 8A (8/20µs); Operating Temperature: -55°C ~ 125°C (TJ); ComponentLink1Description: Datasheet; ComponentLink1URL: https://datasheet.lcsc.com/lcsc/1809291621_SEMTECH-SMF05C-TCT_C85191.pdf*; ComponentLink2Description: Thegioiic; ComponentLink2URL: https://www.thegioiic.com/smf05c-tct
footprint SC70 6L (SOT23, 6-Leads, Body 1.95x2.10mm, Pitch 0.65mm, IPC Medium Density)
part A pins: 1, 2 COM
part B pins: 2 COM, 3
part C pins: 2 COM, 4
part D pins: 2 COM, 5
part E pins: 2 COM, 6

## SQ4840EY
designator U?
ComponentLink1Description: New link; ComponentLink1URL: https://www.vishay.com/docs/68669/sq4840ey.pdf
footprint SQ4840EY (SOIC, 8-Leads, Body 4.90x3.90mm, Pitch 1.27mm, IPC Medium Density)
pins: 1,2,3 S, 4 G, 5,6,7,8 D

## Stamp Hole
designator *  (value not drawn)
footprint Stamp Hole

## STM32F030C8T6
designator U?
ARM® Cortex®-M0 series Microcontroller IC 32-Bit Single-Core 48MHz 64KB (64K x 8) FLASH 48-LQFP (7x7); Mfr: STMicroelectronics; Connectivity: I²C, SPI, UART/USART; Peripherals: DMA, POR, PWM, WDT; Number of I/O: 39; RAM Size: 8K x 8; Voltage - Supply (Vcc/Vdd): 2.4V ~ 3.6V; Data Converters: A/D 12x12b; Oscillator Type: Internal; Core Processor: ARM® Cortex®-M0; Core Size: 32-Bit Single-Core; Speed: 48MHz; Program Memory Size: 64KB (64K x 8); Program Memory Type: FLASH; Operating Temperature: -40°C ~ 85°C (TA); Mounting Type: Surface Mount; Supplier Device Package: 48-LQFP (7x7); ComponentLink1Description: Digikey; ComponentLink1URL: https://www.digikey.com/en/products/detail/stmicroelectronics/STM32F030C8T6/4357252
footprint STM32F030C8T6 (CQFP, 148-Leads, Body 33.75x33.75mm, Pitch 0.64mm, IPC Medium Density)
part A pins: 2 PC13 (io), 3 PC14/OSC32_IN (io), 4 PC15/OSC32_OUT (io), 5 PF0/OSC_IN (io), 6 PF1/OSC_OUT (io), 7 NRST (in), 10 PA0 (io), 11 PA1 (io), 12 PA2 (io), 13 PA3 (io), 14 PA4 (io), 15 PA5 (io), 16 PA6 (io), 17 PA7 (io), 18 PB0 (io), 19 PB1 (io), 20 PB2 (io), 21 PB10 (io), 22 PB11 (io), 25 PB12 (io), 26 PB13 (io), 27 PB14 (io), 28 PB15 (io), 29 PA8 (io), 30 PA9 (io), 31 PA10 (io), 32 PA11 (io), 33 PA12 (io), 34 SYS_SWDIO (io), 35 PF6 (io), 36 PF7 (io), 37 SYS_SWCLK (in), 38 PA15 (io), 39 PB3 (io), 40 PB4 (io), 41 PB5 (io), 42 PB6 (io), 43 PB7 (io), 44 BOOT0 (io), 45 PB8 (io), 46 PB9 (io)
part B pins: 1 VDD (power), 8 VSSA (power), 9 VDDA (power), 23 VSS_1 (power), 24 VDD_1 (power), 47 VSS_2 (power), 48 VDD_2 (power)

## STM32F103C8T6
designator U?
ARM Microcontrollers - MCU 32BIT Cortex M3 64KB 20KB RAM 2X12 ADC; Manufacturer: STMicroelectronics; Core: ARM Cortex M3; ADC Resolution: 12 bit; Maximum Clock Frequency: 72 MHz; Number of I/Os: 37 I/O; Supply Voltage - Min: 2 V; Supply Voltage - Max: 3.6 V; Interface Type: CAN, I2C, SPI, USART, USB; Data RAM Type: SRAM; Number of ADC Channels: 10 Channel; Number of Timers/Counters: 3 Timer; Processor Series: ARM Cortex M; Product Category: ARM Microcontrollers - MCU; Series: STM32F103C8; Mounting Style: SMD/SMT; Package / Case: LQFP-48; Program Memory Size: 64 kB; Data Bus Width: 32 bit; Data RAM Size: 20 kB; Minimum Operating Temperature: - 40 C; Maximum Operating Temperature: + 85 C; Length: 7 mm; ComponentLink1Description: Datasheet; ComponentLink1URL: https://www.mouser.vn/datasheet/2/389/stm32f103c8-1851025.pdf
footprint LQFP48 (CQFP, 148-Leads, Body 33.75x33.75mm, Pitch 0.64mm, IPC Medium Density)
part A pins: 1 VBAT (power), 8 VSSA (power), 9 VDDA (power), 23 VSS_1 (power), 24 VDD_1 (power), 35 VSS_2 (power), 36 VDD_2 (power), 47 VDD_3 (power), 48 VDD_3 (power)
part B pins: 2 PC13-TAMPER-RTC (io), 3 PC14/OSC32_IN (io), 4 PC15/OSC32_OUT (io), 5 PD0/OSC_IN (io), 6 PD1/OSC_OUT (io), 7 NRST (in), 10 PA0-WKUP (io), 11 PA1 (io), 12 PA2 (io), 13 PA3 (io), 14 PA4 (io), 15 PA5 (io), 16 PA6 (io), 17 PA7 (io), 18 PB0 (io), 19 PB1 (io), 20 PB2 (io), 21 PB10 (io), 22 PB11 (io), 25 PB12 (io), 26 PB13 (io), 27 PB14 (io), 28 PB15 (io), 29 PA8 (io), 30 PA9 (io), 31 PA10 (io), 32 PA11 (io), 33 PA12 (io), 34 SYS_SWDIO (io), 37 SYS_SWCLK (in), 38 PA15 (io), 39 PB3 (io), 40 PB4 (io), 41 PB5 (io), 42 PB6 (io), 43 PB7 (io), 44 BOOT0 (io), 45 PB8 (io), 46 PB9 (io)

## STM32F205VCT6
designator U?  (value not drawn)
ARM® Cortex®-M3 STM32F2 Microcontroller IC 32-Bit Single-Core 120MHz 256KB (256K x 8) FLASH 100-LQFP (14x14); Mfr: STMicroelectronics; Connectivity: CANbus, I²C, IrDA, LINbus, MMC, SPI, UART/USART, USB OTG; Peripherals: Brown-out Detect/Reset, DMA, I²S, LCD, POR, PWM, WDT; Number of I/O: 82; RAM Size: 100K x 8; Voltage - Supply (Vcc/Vdd): 1.8V ~ 3.6V; Data Converters: /D 16x12b; D/A 2x12b; Oscillator Type: Internal; Series: STM32F2; Core Processor: ARM® Cortex®-M3; Core Size: 32-Bit Single-Core; Speed: 120MHz; Program Memory Size: 256KB (256K x 8); Program Memory Type: FLASH; Operating Temperature: -40°C ~ 85°C (TA); Mounting Type: Surface Mount; Package / Case: 100-LQFP; Supplier Device Package: 100-LQFP (14x14); Base Product Number: STM32F205; ComponentLink1Description: Digikey; ComponentLink1URL: https://www.digikey.com/en/products/detail/stmicroelectronics/STM32F205VCT6/2640805
footprint STM32F205VCT6 (CQFP, 100-Leads, Body 18.70x18.70mm, Pitch 0.50mm, IPC Medium Density)
part A pins: 23 PA0 (io), 24 PA1 (io), 25 PA2 (io), 26 PA3 (io), 29 PA4 (io), 30 PA5 (io), 31 PA6 (io), 32 PA7 (io), 67 PA8 (io), 68 PA9 (io), 69 PA10 (io), 70 PA11 (io), 71 PA12 (io), 72 PA13 (io), 76 PA14 (io), 77 PA15 (io)
part B pins: 35 PB0 (io), 36 PB1 (io), 37 PB2 (io), 47 PB10 (io), 48 PB11 (io), 51 PB12 (io), 52 PB13 (io), 53 PB14 (io), 54 PB15 (io), 89 PB3 (io), 90 PB4 (io), 91 PB5 (io), 92 PB6 (io), 93 PB7 (io), 95 PB8 (io), 96 PB9 (io)
part C pins: 7 PC13-RTC_AF1 (io), 8 PC14-OSC32_IN (io), 9 PC15-OSC32_OUT  (io), 15 PC0 (io), 16 PC1 (io), 17 PC2 (io), 18 PC3 (io), 33 PC4 (io), 34 PC5 (io), 63 PC6 (io), 64 PC7 (io), 65 PC8 (io), 66 PC9 (io), 78 PC10 (io), 79 PC11 (io), 80 PC12 (io)
part D pins: 55 PD8 (io), 56 PD9 (io), 57 PD10 (io), 58 PD11 (io), 59 PD12 (io), 60 PD13 (io), 61 PD14 (io), 62 PD15 (io), 81 PD0 (io), 82 PD1 (io), 83 PD2 (io), 84 PD3 (io), 85 PD4 (io), 86 PD5 (io), 87 PD6 (io), 88 PD7 (io)
part E pins: 1 PE2 (io), 2 PE3 (io), 3 PE4 (io), 4 PE5 (io), 5 PE6 (io), 38 PE7 (io), 39 PE8 (io), 40 PE9 (io), 41 PE10 (io), 42 PE11 (io), 43 PE12 (io), 44 PE13 (io), 45 PE14 (io), 46 PE15 (io), 97 PE0 (io), 98 PE1 (io)
part F pins: 6 VBAT (power), 10 VSS (power), 11 VDD (power), 12 PH0-OSC_IN, 13 PH1-OSC_OUT, 14 NRST (io), 19 VDD (power), 20 VSSA (power), 21 VREF+ (power), 22 VDDA (power), 27 VSS (power), 28 VDD (power), 49 VCAP_1 (power), 50 VDD (power), 73 VCAP_2 (power), 74 VSS (power), 75 VDD (power), 94 BOOT0, 99 RFU, 100 VDD (power)

## TDZ3V3J,115
designator D?
ComponentLink1Description: New link; ComponentLink1URL: https://assets.nexperia.com/documents/data-sheet/TDZXJ_SER.pdf
footprint TDZ3V3J,115 (SODFL, 2-Leads, Body 1.65x3.05mm, IPC Medium Density)
pins: 1 K, 2 A

## TN5D61A
designator U?, comment TN5D61A-HB11-E
Buck Switching Regulator IC Positive Fixed 24V 1 Output 5A TO-220-5 Full Pack, Formed Leads; Mfr: onsemi; Function: Step-Down; Number of Outputs: 1; Voltage - Input (Min): 30V; Voltage - Input (Max): 48V; Frequency - Switching: 150kHz; ComponentLink1Description: Digikey; ComponentLink1URL: https://www.digikey.com/en/products/detail/onsemi/TN5D61A-HB11-E/2797346; Output Configuration: Positive; Topology: Buck; Output Type: Fixed; Voltage - Output (Min/Fixed): 24V; Current - Output: 5A; Operating Temperature: -10°C ~ 85°C (TA); Mounting Type: Through Hole; Package / Case: TO-220-5 Full Pack, Formed Leads
footprint TN5D61A
pins: 1 Vin, 2 GND, 3 SWout, 4 FB, 5 SS

## TPC8048-H
designator U?
footprint TPC8048-H (SOIC, 8-Leads, Body 5.35x4.50mm, Pitch 1.27mm, IPC Medium Density)
pins: 1,2,3 S, 4 G, 5,6,7,8 D

## TPS54231
designator U?, comment TPS54231D
Buck Switching Regulator IC Positive Adjustable 0.8V 1 Output 2A 8-SOIC (0.154", 3.90mm Width); Mfr: Texas Instruments; Function: Step-Down; Number of Outputs: 1; Voltage - Input (Min): 3.5V; Voltage - Input (Max): 28V; Voltage - Output (Max): 25V; Frequency - Switching: 570kHz; Category: Integrated Circuits (ICs); Output Configuration: Positive; Topology: Buck; Output Type: Adjustable; Voltage - Output (Min/Fixed): 0.8V; Current - Output: 2A; Operating Temperature: -40°C ~ 150°C (TJ); Mounting Type: Surface Mount; ComponentLink1Description: Thegioiic; ComponentLink1URL: https://www.thegioiic.com/tps54231dr-ic-dieu-chinh-giam-ap-2a-8-soic; ComponentLink2Description: Datasheet; ComponentLink2URL: https://www.ti.com/lit/ds/symlink/tps54231.pdf
footprint SOIC8 (SOIC, 8-Leads, Body 4.91x3.90mm, Pitch 1.27mm, Thermal Pad 0.00x0.00mm, IPC Medium Density)
pins: 1 BOOT, 2 VIN, 3 EN, 4 SS, 5 VSNS, 6 COMP, 7 GND, 8 PH

## TSOP1838
designator IR?
TSOP1838 LED Recierve IR; Supply voltage: -0.3...6V; Supply Current: 5mA; Power Consumption: 50mW; Directivity: ±45; Transmission Distance: 35m; ComponentLink1Description: thegioiic; ComponentLink1URL: https://www.thegioiic.com/tsop1838-led-thu-hong-ngoai
footprint TSOP1838
pins: GND, OUT, VCC V+

## TTP223
designator NOTE?
footprint TTP223
pins: 1 GND, 2 I/O, 3 VCC

## UC3843BD1R
designator U?, comment UC3843BD1R2
IC REG CTRLR FLYBACK 8SOIC; Mfr: onsemi; Output Type: Transistor Driver; Function: Step-Up, Step-Up/Step-Down; Output Configuration: Positive, Isolation Capable; Topology: Boost, Flyback; Number of Outputs: 1; Voltage - Supply (Vcc/Vdd): 7.6V ~ 30V; Frequency - Switching: Up to 500kHz; Duty Cycle (Max): 96%; Category: Integrated Circuits (ICs); Package: Tape & Reel (TR); Output Phases: 1; Operating Temperature: 0°C ~ 70°C (TA); Mounting Type: Surface Mount; Package / Case: 8-SOIC (0.154", 3.90mm Width); ComponentLink1Description: Digikey; ComponentLink1URL: https://www.digikey.com/en/products/detail/onsemi/UC3843BD1R2/661045
footprint UC3843BD1R2 (SOIC, 8-Leads, Body 4.90x3.90mm, Pitch 1.27mm, IPC Medium Density)
pins: 1 Compensation, 2 Voltage Feedback, 3 Current Sense, 4 RT/CT, 5 GND, 6 Output, 7 VCC, 8 Vref

## US1A-13-F
designator D?
Diode Standard 50 V 1A Surface Mount SMA; Mfr: Diodes Incorporated; Voltage - DC Reverse (Vr) (Max): 50 V; Voltage - Forward (Vf) (Max) @ If: 1 V @ 1 A; Speed: Fast Recovery =< 500ns, > 200mA (Io); Reverse Recovery Time (trr): 50 ns; Current - Reverse Leakage @ Vr: 5 µA @ 50 V; Capacitance @ Vr, F: 20pF @ 4V, 1MHz; Diode Type: Standard; Current - Average Rectified (Io): 1A; Mounting Type: Surface Mount; Package / Case: DO-214AC, SMA; Supplier Device Package: SMA; Operating Temperature - Junction: -65°C ~ 150°C; ComponentLink1Description: Digikey; ComponentLink1URL: https://www.digikey.com/en/products/detail/diodes-incorporated/US1A-13-F/814658?s=N4IgTCBcDaIKoGUCMBBAtEgzGgYiAugL5A
footprint US1A-13-F (Molded Diode, 2-Leads, Body 4.30x2.61mm, IPC Medium Density)
pins: 1 A, 2 K